# Altium footprint library KwantLib.PcbLib: 249 footprints (part 1 of 16)
Each footprint in its own frame and in the unit in brackets; x right, y up, seen from the top. Pads: shape width x height; smd on the part's side, far side on the other; paste and mask are expansions set on the pad; w line width, h text height; cw(c..) or ccw(c..) is an arc to the next point about the centre after c.
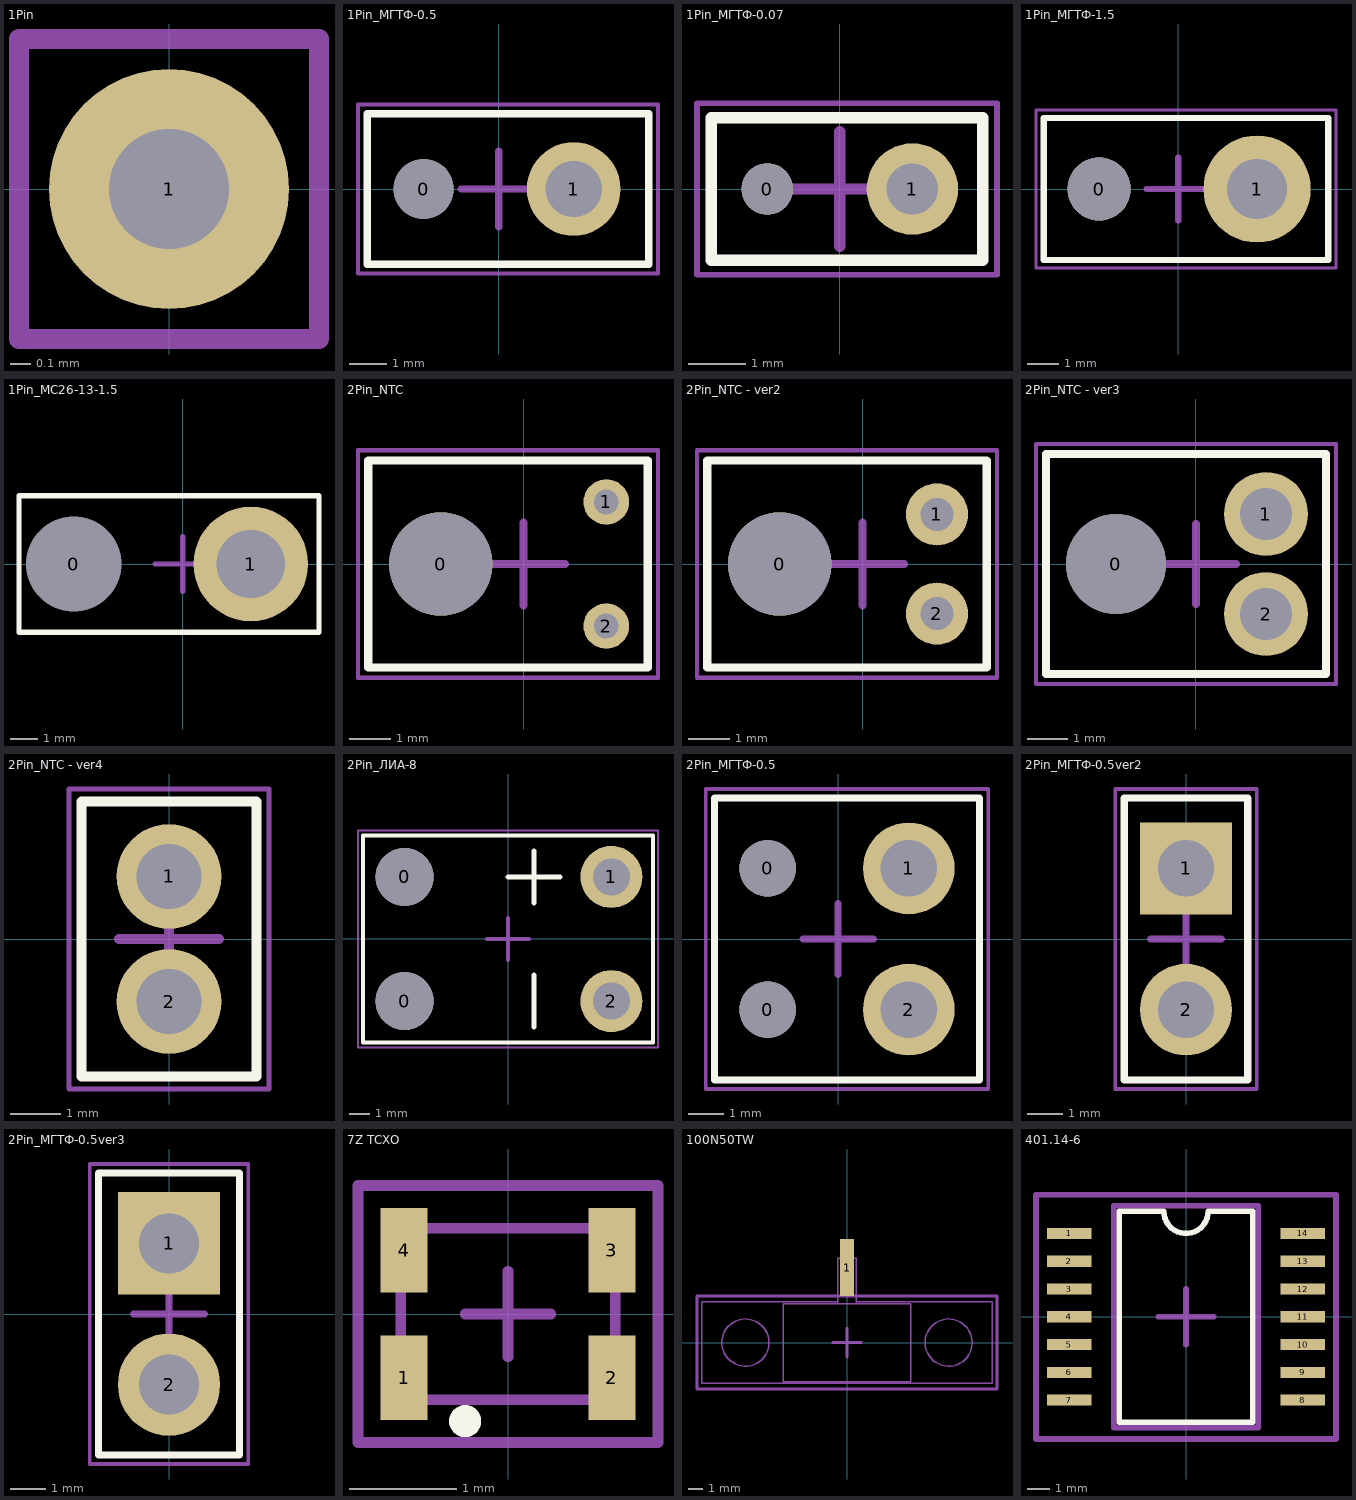
[diagram p0: the footprints below, top view; thin cyan lines are the x and y axes]

## 1Pin [mm]
pads (1):
  round 1.2 hole 0.6: 1(0,0)
Mechanical 15:
  lines w0.1: -0.75,-0.75 -0.75,0.75 0.75,0.75 0.75,-0.75 -0.75,-0.75

## 1Pin_МГТФ-0.5 [mm] "Силовой вывод под МГТФ 0.5"
pads (2):
  round 1.6 hole 1.6 unplated: 0(-2,0)
  round 2.5 hole 1.5: 1(2,0)
Top Overlay:
  lines w0.2: -3.5,-2 -3.5,2 4,2 4,-2 -3.5,-2
Mechanical 15:
  lines w0.1: -3.75,-2.25 4.25,-2.25 4.25,2.25 -3.75,2.25 -3.75,-2.25
  lines w0.2: -1,0 1,0 ; 0,-1 0,1

## 1Pin_МГТФ-0.07 [mm] "Силовой вывод под МГТФ 0.07"
pads (2):
  round 0.9 hole 0.9 unplated: 0(-1.27,0)
  round 1.6 hole 0.9: 1(1.27,0)
Top Overlay:
  lines w0.2: -2.25,-1.25 2.5,-1.25 2.5,1.25 -2.25,1.25 -2.25,-1.25
Mechanical 15:
  lines w0.1: -2.5,-1.5 -2.5,1.5 2.75,1.5 2.75,-1.5 -2.5,-1.5
  lines w0.2: -1,0 1,0 ; 0,-1 0,1

## 1Pin_МГТФ-1.5 [mm] "Силовой вывод под МГТФ 1.5"
pads (2):
  round 2 hole 2 unplated: 0(-2.5,0)
  round 3.4 hole 1.9: 1(2.5,0)
Top Overlay:
  lines w0.2: -4.25,-2.25 4.75,-2.25 4.75,2.25 -4.25,2.25 -4.25,-2.25
Mechanical 15:
  lines w0.1: -4.5,-2.5 -4.5,2.5 5,2.5 5,-2.5 -4.5,-2.5
  lines w0.2: -1,0 1,0 ; 0,-1 0,1

## 1Pin_МС26-13-1.5 [mm] "Силовой вывод под МС26-13-1.5, Dmax - 2.3mm"
pads (2):
  round 2 hole 3.5 unplated: 0(-4,0)
  round 4.2 hole 2.5: 1(2.5,0)
Top Overlay:
  lines w0.2: -6,-2.5 -6,2.5 5,2.5 5,-2.5 -6,-2.5
Mechanical 15:
  lines w0.1: -6,-2.5 5,-2.5 5,2.5 -6,2.5 -6,-2.5
  lines w0.2: -1,0 1,0 ; 0,-1 0,1

## 2Pin_NTC [mm] "Выводы терморезистора"
pads (3):
  round 2.5 hole 2.5 unplated: 0(-2,0)
  round 1.1 hole 0.6: 1(2,1.5) 2(2,-1.5)
Top Overlay:
  lines w0.2: -3.75,-2.5 -3.75,2.5 3,2.5 3,-2.5 -3.75,-2.5
Mechanical 15:
  lines w0.1: -4,-2.75 3.25,-2.75 3.25,2.75 -4,2.75 -4,-2.75
  lines w0.2: -1,0 1,0 ; 0,-1 0,1

## 2Pin_NTC - ver2 [mm] "Выводы терморезистора"
pads (3):
  round 2.5 hole 2.5 unplated: 0(-2,0)
  round 1.5 hole 0.8: 1(1.8,1.2) 2(1.8,-1.2)
Top Overlay:
  lines w0.2: -3.75,-2.5 -3.75,2.5 3,2.5 3,-2.5 -3.75,-2.5
Mechanical 15:
  lines w0.1: -4,-2.75 3.25,-2.75 3.25,2.75 -4,2.75 -4,-2.75
  lines w0.2: -1,0 1,0 ; 0,-1 0,1

## 2Pin_NTC - ver3 [mm] "Выводы терморезистора На шпенек"
pads (3):
  round 2.5 hole 2.5 unplated: 0(-2,0)
  round 2.1 hole 1.3: 1(1.75,1.25) 2(1.75,-1.25)
Top Overlay:
  lines w0.2: -3.75,-2.75 3.25,-2.75 3.25,2.75 -3.75,2.75 -3.75,-2.75
Mechanical 13:
  circle w0.1: c1.75,-1.25 r0.785
  circle w0.1: c1.75,1.25 r0.785
Mechanical 15:
  lines w0.1: -4,-3 -4,3 3.5,3 3.5,-3 -4,-3
  lines w0.2: -1,0 1,0 ; 0,-1 0,1
3D body "1528-2.stp": height 2.37, standoff -2.12, extent 0.965,-2.034 2.535,-0.465
3D body "1528-2.stp": height 2.37, standoff -2.12, extent 0.965,0.466 2.535,2.035

## 2Pin_NTC - ver4 [mm] "Выводы терморезистора На шпенек"
pads (2):
  round 2.1 hole 1.3: 1(0,1.25) 2(0,-1.25)
Top Overlay:
  lines w0.2: -1.75,-2.75 1.75,-2.75 1.75,2.75 -1.75,2.75 -1.75,-2.75
Mechanical 13:
  circle w0.1: c0,-1.25 r0.785
  circle w0.1: c0,1.25 r0.785
Mechanical 15:
  lines w0.1: -2,-3 -2,3 2,3 2,-3 -2,-3
  lines w0.2: -1,0 1,0 ; 0,-1 0,1
3D body "1528-2.stp": height 2.37, standoff -2.12, extent -0.785,-2.034 0.785,-0.465
3D body "1528-2.stp": height 2.37, standoff -2.12, extent -0.785,0.466 0.785,2.035

## 2Pin_ЛИА-8 [mm] "Силовой вывод под аккумулятор ЛИА-8"
pads (4):
  round 2.8 hole 2.8 unplated: 0(-5,-3) 0(-5,3)
  round 3 hole 1.8: 1(5,3) 2(5,-3)
Top Overlay:
  lines w0.2: -7,-5 7,-5 7,5 -7,5 -7,-5
  lines w0.25: 0,3 2.5,3 ; 1.25,-4.25 1.25,-1.75 ; 1.25,1.75 1.25,4.25
Mechanical 15:
  lines w0.1: -7.25,-5.25 -7.25,5.25 7.25,5.25 7.25,-5.25 -7.25,-5.25
  lines w0.2: -1,0 1,0 ; 0,-1 0,1

## 2Pin_МГТФ-0.5 [mm] "Силовой вывод под 2 МГТФ 0.5"
pads (4):
  round 1.6 hole 1.6 unplated: 0(-2,-2) 0(-2,2)
  round 2.6 hole 1.6: 1(2,2) 2(2,-2)
Top Overlay:
  lines w0.2: -3.5,-4 4,-4 4,4 -3.5,4 -3.5,-4
Mechanical 15:
  lines w0.1: -3.75,-4.25 -3.75,4.25 4.25,4.25 4.25,-4.25 -3.75,-4.25
  lines w0.2: -1,0 1,0 ; 0,-1 0,1

## 2Pin_МГТФ-0.5ver2 [mm] "Силовой вывод под 2 МГТФ 0.5"
pads (2):
  rect 2.6x2.6 hole 1.6: 1(0,2)
  round 2.6 hole 1.6: 2(0,-2)
Top Overlay:
  lines w0.2: -1.75,-4 1.75,-4 1.75,4 -1.75,4 -1.75,-4
Mechanical 15:
  lines w0.1: -2,-4.25 -2,4.25 2,4.25 2,-4.25 -2,-4.25
  lines w0.2: -1,0 1,0 ; 0,-1 0,1

## 2Pin_МГТФ-0.5ver3 [mm] "Силовой вывод под 2 МГТФ 0.5 на Шпенек"
pads (2):
  rect 2.9x2.9 hole 1.7: 1(0,2)
  round 2.9 hole 1.7: 2(0,-2)
Top Overlay:
  lines w0.2: -2,-4 -2,4 2,4 2,-4 -2,-4
Mechanical 13:
  circle w0.1: c0,-2 r1.195
  circle w0.1: c0,2 r1.195
Mechanical 15:
  lines w0.1: -2.25,-4.25 2.25,-4.25 2.25,4.25 -2.25,4.25 -2.25,-4.25
  lines w0.2: -1,0 1,0 ; 0,-1 0,1
3D body "1508-2.stp": height 2.37, standoff -2.12, extent -1.195,-3.194 1.195,-0.805
3D body "1508-2.stp": height 2.37, standoff -2.12, extent -1.195,0.806 1.195,3.195

## 7Z TCXO [mm]
pads (4):
  rect 0.44x0.79 smd mask+0.07: 1(-0.97,-0.595) 2(0.97,-0.595) 3(0.97,0.595) 4(-0.97,0.595)
Top Overlay:
  lines w0.2: -0.35,-1 cw(c-0.4,-1) -0.351,-0.99
Mechanical 13:
  lines w0.1: -1,-0.8 -1,0.8 1,0.8 1,-0.8 -1,-0.8
Mechanical 15:
  lines w0.1: -0.4,0 0.4,0 ; 0,-0.4 0,0.4 ; -1.4,-1.2 -1.4,1.2 1.4,1.2 1.4,-1.2 -1.4,-1.2
3D body: height 0.75, standoff 0.02, extent -1,-0.8 1,0.8

## 100N50TW [mm] "Резистор 50 Ом СВЧ"
pads (1):
  rect 1x4 smd: 1(0,5.25)
Mechanical 13:
  circle w0.1: c7.112,0 r1.651
  circle w0.1: c-7.112,0 r1.651
  lines w0.1: -0.635,2.73 -0.635,5.905 0.635,5.905 0.635,2.73 ; -0.635,2.857 -10.16,2.857 -10.16,-2.857 10.16,-2.857 10.16,2.857 0.635,2.857 ; -4.445,-2.73 4.445,-2.73 4.445,2.73 -4.445,2.73 -4.445,-2.73
Mechanical 15:
  lines w0.2: -1,0 1,0 ; 0,-1 0,1 ; -10.5,-3.25 -10.5,3.25 10.5,3.25 10.5,-3.25 -10.5,-3.25
3D body "100N50TW.stp": height 1.12, standoff -2.95, extent -10.16,-2.857 10.16,5.906

## 401.14-6 [mm] "ВЗПП-С керамика"
height 2.3
pads (14):
  rect 2x0.5 smd: 1(-5.25,3.75) 2(-5.25,2.5) 3(-5.25,1.25) 4(-5.25,0) 5(-5.25,-1.25) 6(-5.25,-2.5) 7(-5.25,-3.75) 8(5.25,-3.75) 9(5.25,-2.5) 10(5.25,-1.25) 11(5.25,0) 12(5.25,1.25) 13(5.25,2.5) 14(5.25,3.75)
Top Overlay:
  lines w0.25: -3,-4.75 -3,4.75 -1,4.75 ccw(c0,4.75) 1,4.75 3,4.75 3,-4.75 -3,-4.75
Mechanical 13:
  lines w0.25: -3.25,-5 3.25,-5 3.25,5 -3.25,5 -3.25,-5
Mechanical 15:
  lines w0.25: -1.25,0 1.25,0 ; 0,-1.25 0,1.25 ; -6.75,-5.5 6.75,-5.5 6.75,5.5 -6.75,5.5 -6.75,-5.5
3D body: height 2.3, standoff 0.01, extent -3.25,-5 3.25,5